# Altium footprint library ICs And Semiconductors SMD_BGA.PcbLib: 118 footprints (part 4 of 17)
Each footprint in its own frame and in the unit in brackets; x right, y up, seen from the top. Pads: shape width x height; smd on the part's side, far side on the other; paste and mask are expansions set on the pad; w line width, h text height; cw(c..) or ccw(c..) is an arc to the next point about the centre after c.
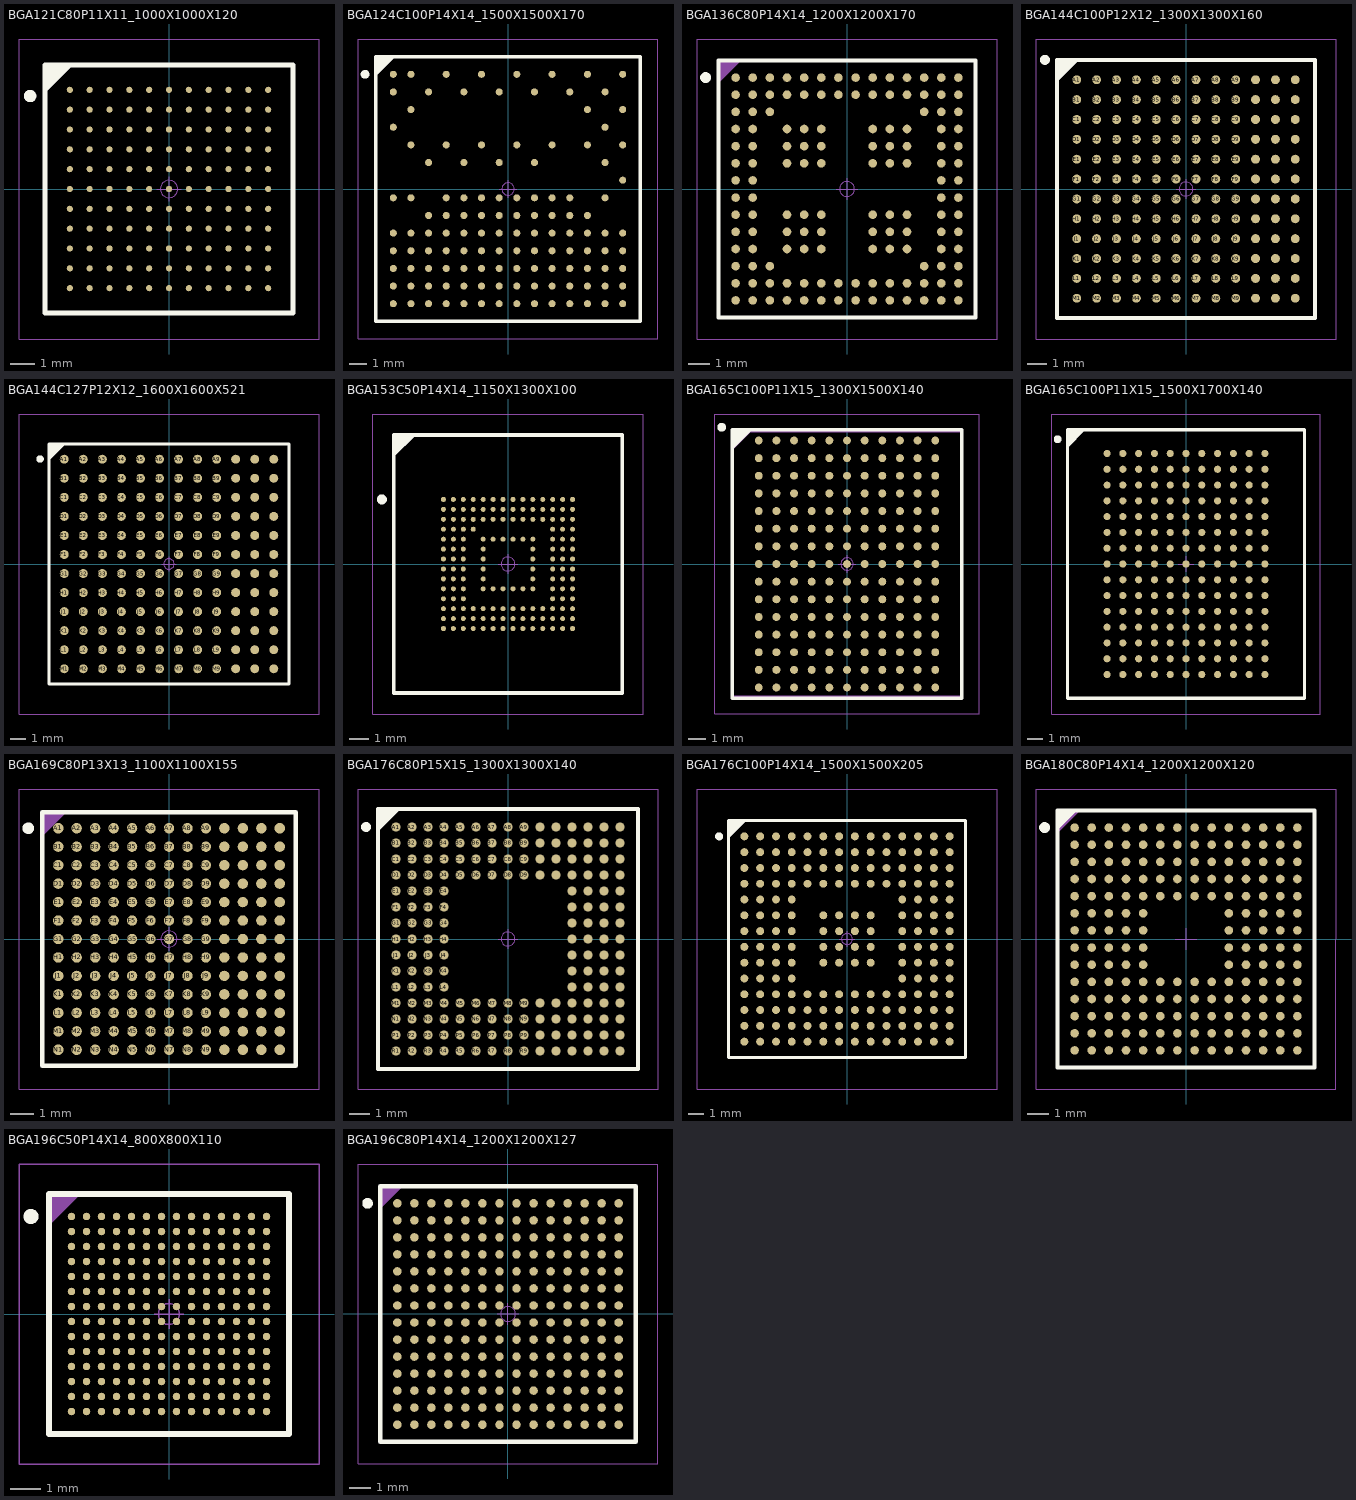
[diagram p3: the footprints below, top view; thin cyan lines are the x and y axes]

## BGA121C80P11X11_1000X1000X120 [mm] "BGA, 0.80mm Pitch, Square; 121 Pin,11 Columns X 11 Rows,10.00mm X 10.00mm X 1.20mm H"
height 1.2
pads (121):
  round 0.25 smd: A1(-4,4) A2(-3.2,4) A3(-2.4,4) A4(-1.6,4) A5(-0.8,4) A6(0,4) A7(0.8,4) A8(1.6,4) A9(2.4,4) A10(3.2,4) A11(4,4) B1(-4,3.2) B2(-3.2,3.2) B3(-2.4,3.2) B4(-1.6,3.2) B5(-0.8,3.2) B6(0,3.2) B7(0.8,3.2) B8(1.6,3.2) B9(2.4,3.2) B10(3.2,3.2) B11(4,3.2) C1(-4,2.4) C2(-3.2,2.4) C3(-2.4,2.4) C4(-1.6,2.4) C5(-0.8,2.4) C6(0,2.4) C7(0.8,2.4) C8(1.6,2.4) C9(2.4,2.4) C10(3.2,2.4) C11(4,2.4) D1(-4,1.6) D2(-3.2,1.6) D3(-2.4,1.6) D4(-1.6,1.6) D5(-0.8,1.6) D6(0,1.6) D7(0.8,1.6) D8(1.6,1.6) D9(2.4,1.6) D10(3.2,1.6) D11(4,1.6) E1(-4,0.8) E2(-3.2,0.8) E3(-2.4,0.8) E4(-1.6,0.8) E5(-0.8,0.8) E6(0,0.8) E7(0.8,0.8) E8(1.6,0.8) E9(2.4,0.8) E10(3.2,0.8) E11(4,0.8) F1(-4,0) F2(-3.2,0) F3(-2.4,0) F4(-1.6,0) F5(-0.8,0) F6(0,0) F7(0.8,0) F8(1.6,0) F9(2.4,0) F10(3.2,0) F11(4,0) G1(-4,-0.8) G2(-3.2,-0.8) G3(-2.4,-0.8) G4(-1.6,-0.8) G5(-0.8,-0.8) G6(0,-0.8) G7(0.8,-0.8) G8(1.6,-0.8) G9(2.4,-0.8) G10(3.2,-0.8) G11(4,-0.8) H1(-4,-1.6) H2(-3.2,-1.6) H3(-2.4,-1.6) H4(-1.6,-1.6) H5(-0.8,-1.6) H6(0,-1.6) H7(0.8,-1.6) H8(1.6,-1.6) H9(2.4,-1.6) H10(3.2,-1.6) H11(4,-1.6) J1(-4,-2.4) J2(-3.2,-2.4) J3(-2.4,-2.4) J4(-1.6,-2.4) J5(-0.8,-2.4) J6(0,-2.4) J7(0.8,-2.4) J8(1.6,-2.4) J9(2.4,-2.4) J10(3.2,-2.4) J11(4,-2.4) K1(-4,-3.2) K2(-3.2,-3.2) K3(-2.4,-3.2) K4(-1.6,-3.2) K5(-0.8,-3.2) K6(0,-3.2) K7(0.8,-3.2) K8(1.6,-3.2) K9(2.4,-3.2) K10(3.2,-3.2) K11(4,-3.2) L1(-4,-4) L2(-3.2,-4) L3(-2.4,-4) L4(-1.6,-4) L5(-0.8,-4) L6(0,-4) L7(0.8,-4) L8(1.6,-4) L9(2.4,-4) L10(3.2,-4) L11(4,-4)
Top Overlay:
  circle w0.25: c-5.6,3.75 r0.125
  lines w0.2: -5,4 -4,5 ; -5,4.2 -4.2,5 ; -5,4.4 -4.4,5 ; -5,4.6 -4.6,5 ; -5,4.8 -4.8,5 ; -5,-5 -5,5 5,5 5,-5 -5,-5
Mechanical 14:
  lines w0.1: -5,4 -4,5 ; -5,4.1 -4.1,5 ; -5,4.2 -4.2,5 ; -5,4.3 -4.3,5 ; -5,4.4 -4.4,5 ; -5,4.5 -4.5,5 ; -5,4.6 -4.6,5 ; -5,4.7 -4.7,5 ; -5,4.8 -4.8,5 ; -5,4.9 -4.9,5 ; -5,-5 -5,5 5,5 5,-5 -5,-5
  text "1" at -4.125,5.275 h0.4
  text "2" at -3.325,5.275 h0.4
  text "3" at -2.525,5.275 h0.4
  text "6" at -0.125,5.275 h0.4
  text "5" at -0.925,5.275 h0.4
  text "4" at -1.725,5.275 h0.4
  text "9" at 2.275,5.275 h0.4
  text "8" at 1.475,5.275 h0.4
  text "7" at 0.675,5.275 h0.4
  text "11" at 4.025,5.275 h0.4
  text "10" at 3.075,5.275 h0.4
  text "J" at -5.625,-2.475 h0.4
  text "A" at -5.625,3.925 h0.4
  text "B" at -5.625,3.125 h0.4
  text "C" at -5.625,2.325 h0.4
  text "D" at -5.625,1.525 h0.4
  text "E" at -5.625,0.725 h0.4
  text "F" at -5.625,-0.075 h0.4
  text "G" at -5.625,-0.875 h0.4
  text "H" at -5.625,-1.675 h0.4
  text "K" at -5.625,-3.275 h0.4
  text "L" at -5.625,-4.075 h0.4
Mechanical 15:
  circle w0.05: c0,0 r0.35
  lines w0.05: -0.5,0 0.5,0 ; 0,-0.5 0,0.5 ; -6.05,-6.05 -6.05,6.05 6.05,6.05 6.05,-6.05 -6.05,-6.05
3D body "BGA121C80P11X11_1000X1000X120.stp": height 1.2, standoff 0, extent -5.05,-5.05 5.05,5.05

## BGA124C100P14X14_1500X1500X170 [mm] "BGA, 1.00mm Pitch, Square;124 Pin,14 Columns X 14 Rows, 15.00mm X 15.00mm X 1.70mm H"
height 1.47
pads (124):
  round 0.4 smd: A1(-6.5,6.5) A2(-5.5,6.5) A4(-3.5,6.5) A6(-1.5,6.5) A8(0.5,6.5) A10(2.5,6.5) A12(4.5,6.5) A14(6.5,6.5) B1(-6.5,5.5) B3(-4.5,5.5) B5(-2.5,5.5) B7(-0.5,5.5) B9(1.5,5.5) B11(3.5,5.5) B13(5.5,5.5) C2(-5.5,4.5) C12(4.5,4.5) C14(6.5,4.5) D1(-6.5,3.5) D13(5.5,3.5) E2(-5.5,2.5) E4(-3.5,2.5) E6(-1.5,2.5) E8(0.5,2.5) E10(2.5,2.5) E12(4.5,2.5) E14(6.5,2.5) F3(-4.5,1.5) F5(-2.5,1.5) F7(-0.5,1.5) F9(1.5,1.5) F13(5.5,1.5) G14(6.5,0.5) H1(-6.5,-0.5) H2(-5.5,-0.5) H4(-3.5,-0.5) H5(-2.5,-0.5) H6(-1.5,-0.5) H7(-0.5,-0.5) H8(0.5,-0.5) H9(1.5,-0.5) H10(2.5,-0.5) H11(3.5,-0.5) H13(5.5,-0.5) J3(-4.5,-1.5) J4(-3.5,-1.5) J5(-2.5,-1.5) J6(-1.5,-1.5) J7(-0.5,-1.5) J8(0.5,-1.5) J9(1.5,-1.5) J10(2.5,-1.5) J11(3.5,-1.5) J12(4.5,-1.5) K1(-6.5,-2.5) K2(-5.5,-2.5) K3(-4.5,-2.5) K4(-3.5,-2.5) K5(-2.5,-2.5) K6(-1.5,-2.5) K7(-0.5,-2.5) K8(0.5,-2.5) K9(1.5,-2.5) K10(2.5,-2.5) K11(3.5,-2.5) K12(4.5,-2.5) K13(5.5,-2.5) K14(6.5,-2.5) L1(-6.5,-3.5) L2(-5.5,-3.5) L3(-4.5,-3.5) L4(-3.5,-3.5) L5(-2.5,-3.5) L6(-1.5,-3.5) L7(-0.5,-3.5) L8(0.5,-3.5) L9(1.5,-3.5) L10(2.5,-3.5) L11(3.5,-3.5) L12(4.5,-3.5) L13(5.5,-3.5) L14(6.5,-3.5) M1(-6.5,-4.5) M2(-5.5,-4.5) M3(-4.5,-4.5) M4(-3.5,-4.5) M5(-2.5,-4.5) M6(-1.5,-4.5) M7(-0.5,-4.5) M8(0.5,-4.5) M9(1.5,-4.5) M10(2.5,-4.5) M11(3.5,-4.5) M12(4.5,-4.5) M13(5.5,-4.5) M14(6.5,-4.5) N1(-6.5,-5.5) N2(-5.5,-5.5) N3(-4.5,-5.5) N4(-3.5,-5.5) N5(-2.5,-5.5) N6(-1.5,-5.5) N7(-0.5,-5.5) N8(0.5,-5.5) N9(1.5,-5.5) N10(2.5,-5.5) N11(3.5,-5.5) N12(4.5,-5.5) N13(5.5,-5.5) N14(6.5,-5.5) P1(-6.5,-6.5) P2(-5.5,-6.5) P3(-4.5,-6.5) P4(-3.5,-6.5) P5(-2.5,-6.5) P6(-1.5,-6.5) P7(-0.5,-6.5) P8(0.5,-6.5) P9(1.5,-6.5) P10(2.5,-6.5) P11(3.5,-6.5) P12(4.5,-6.5) P13(5.5,-6.5) P14(6.5,-6.5)
Top Overlay:
  circle w0.25: c-8.1,6.5 r0.125
  circle w0.25: c-8.1,6.5 r0.125
  lines w0.2: -7.5,6.5 -6.5,7.5 ; -7.5,6.7 -6.7,7.5 ; -7.5,6.9 -6.9,7.5 ; -7.5,7.1 -7.1,7.5 ; -7.5,7.3 -7.3,7.5 ; -7.5,-7.5 7.5,-7.5 7.5,7.5 -7.5,7.5 -7.5,-7.5
Mechanical 14:
  lines w0.1: -7.5,6.5 -6.5,7.5 ; -7.5,6.6 -6.6,7.5 ; -7.5,6.7 -6.7,7.5 ; -7.5,6.8 -6.8,7.5 ; -7.5,6.9 -6.9,7.5 ; -7.5,7 -7,7.5 ; -7.5,7.1 -7.1,7.5 ; -7.5,7.2 -7.2,7.5 ; -7.5,7.3 -7.3,7.5 ; -7.5,7.4 -7.4,7.5 ; -7.5,-7.5 7.5,-7.5 7.5,7.5 -7.5,7.5 -7.5,-7.5
  text "P" at -8.4,-6.8 h0.6
  text "N" at -8.4,-5.8 h0.6
  text "M" at -8.4,-4.8 h0.6
  text "L" at -8.4,-3.8 h0.6
  text "K" at -8.4,-2.8 h0.6
  text "J" at -8.4,-1.8 h0.6
  text "H" at -8.4,-0.8 h0.6
  text "G" at -8.4,0.2 h0.6
  text "F" at -8.4,1.2 h0.6
  text "E" at -8.4,2.2 h0.6
  text "D" at -8.4,3.2 h0.6
  text "C" at -8.4,4.2 h0.6
  text "B" at -8.4,5.2 h0.6
  text "A" at -8.4,6.2 h0.6
  text "2" at -5.125,8 h0.6
  text "3" at -4.125,8 h0.6
  text "4" at -3.125,8 h0.6
  text "5" at -2.125,8 h0.6
  text "14" at 6.65,8 h0.6
  text "13" at 5.675,8 h0.6
  text "12" at 4.7,8 h0.6
  text "11" at 3.775,8 h0.6
  text "10" at 2.725,8 h0.6
  text "9" at 1.925,8 h0.6
  text "8" at 0.85,8 h0.6
  text "7" at -0.125,8 h0.6
  text "6" at -1.125,8 h0.6
  text "1" at -6.075,8 h0.6
Mechanical 15:
  circle w0.05: c0,0 r0.35
  lines w0.05: -0.5,0 0.5,0 ; 0,-0.5 0,0.5 ; -8.5,-8.5 8.5,-8.5 8.5,8.5 -8.5,8.5 -8.5,-8.5
3D body "BGA124C100P14X14_1500X1500X170.stp": height 1.7, standoff 0, extent -7.6,-7.6 7.6,7.6

## BGA136C80P14X14_1200X1200X170 [mm] "BGA, 0.80mm Pitch, Square; 136 Pin, 14 Columns X 14 Rows, 12.00mm X 12.00mm X 1.70mm H"
height 1.7
pads (136):
  round 0.4 smd: A1(-5.2,5.2) A2(-4.4,5.2) A3(-3.6,5.2) A4(-2.8,5.2) A5(-2,5.2) A6(-1.2,5.2) A7(-0.4,5.2) A8(0.4,5.2) A9(1.2,5.2) A10(2,5.2) A11(2.8,5.2) A12(3.6,5.2) A13(4.4,5.2) A14(5.2,5.2) B1(-5.2,4.4) B2(-4.4,4.4) B3(-3.6,4.4) B4(-2.8,4.4) B5(-2,4.4) B6(-1.2,4.4) B7(-0.4,4.4) B8(0.4,4.4) B9(1.2,4.4) B10(2,4.4) B11(2.8,4.4) B12(3.6,4.4) B13(4.4,4.4) B14(5.2,4.4) C1(-5.2,3.6) C2(-4.4,3.6) C3(-3.6,3.6) C12(3.6,3.6) C13(4.4,3.6) C14(5.2,3.6) D1(-5.2,2.8) D2(-4.4,2.8) D4(-2.8,2.8) D5(-2,2.8) D6(-1.2,2.8) D9(1.2,2.8) D10(2,2.8) D11(2.8,2.8) D13(4.4,2.8) D14(5.2,2.8) E1(-5.2,2) E2(-4.4,2) E4(-2.8,2) E5(-2,2) E6(-1.2,2) E9(1.2,2) E10(2,2) E11(2.8,2) E13(4.4,2) E14(5.2,2) F1(-5.2,1.2) F2(-4.4,1.2) F4(-2.8,1.2) F5(-2,1.2) F6(-1.2,1.2) F9(1.2,1.2) F10(2,1.2) F11(2.8,1.2) F13(4.4,1.2) F14(5.2,1.2) G1(-5.2,0.4) G2(-4.4,0.4) G13(4.4,0.4) G14(5.2,0.4) H1(-5.2,-0.4) H2(-4.4,-0.4) H13(4.4,-0.4) H14(5.2,-0.4) J1(-5.2,-1.2) J2(-4.4,-1.2) J4(-2.8,-1.2) J5(-2,-1.2) J6(-1.2,-1.2) J9(1.2,-1.2) J10(2,-1.2) J11(2.8,-1.2) J13(4.4,-1.2) J14(5.2,-1.2) K1(-5.2,-2) K2(-4.4,-2) K4(-2.8,-2) K5(-2,-2) K6(-1.2,-2) K9(1.2,-2) K10(2,-2) K11(2.8,-2) K13(4.4,-2) K14(5.2,-2) L1(-5.2,-2.8) L2(-4.4,-2.8) L4(-2.8,-2.8) L5(-2,-2.8) L6(-1.2,-2.8) L9(1.2,-2.8) L10(2,-2.8) L11(2.8,-2.8) L13(4.4,-2.8) L14(5.2,-2.8) M1(-5.2,-3.6) M2(-4.4,-3.6) M3(-3.6,-3.6) M12(3.6,-3.6) M13(4.4,-3.6) M14(5.2,-3.6) N1(-5.2,-4.4) N2(-4.4,-4.4) N3(-3.6,-4.4) N4(-2.8,-4.4) N5(-2,-4.4) N6(-1.2,-4.4) N7(-0.4,-4.4) N8(0.4,-4.4) N9(1.2,-4.4) N10(2,-4.4) N11(2.8,-4.4) N12(3.6,-4.4) N13(4.4,-4.4) N14(5.2,-4.4) P1(-5.2,-5.2) P2(-4.4,-5.2) P3(-3.6,-5.2) P4(-2.8,-5.2) P5(-2,-5.2) P6(-1.2,-5.2) P7(-0.4,-5.2) P8(0.4,-5.2) P9(1.2,-5.2) P10(2,-5.2) P11(2.8,-5.2) P12(3.6,-5.2) P13(4.4,-5.2) P14(5.2,-5.2)
Top Overlay:
  circle w0.25: c-6.6,5.2 r0.125
  lines w0.2: -6,-6 6,-6 6,6 -6,6 -6,-6
Mechanical 14:
  lines w0.1: -6,5 -5,6 ; -6,5.1 -5.1,6 ; -6,5.2 -5.2,6 ; -6,5.3 -5.3,6 ; -6,5.4 -5.4,6 ; -6,5.5 -5.5,6 ; -6,5.6 -5.6,6 ; -6,5.7 -5.7,6 ; -6,5.8 -5.8,6 ; -6,5.9 -5.9,6 ; -6,-6 6,-6 6,6 -6,6 -6,-6
  text "J" at -6.5,-1.2 h0.4
  text "P" at -6.5,-5.2 h0.4
  text "N" at -6.5,-4.4 h0.4
  text "A" at -6.5,5.2 h0.4
  text "B" at -6.5,4.4 h0.4
  text "C" at -6.5,3.6 h0.4
  text "D" at -6.5,2.8 h0.4
  text "E" at -6.5,2 h0.4
  text "F" at -6.5,1.2 h0.4
  text "G" at -6.5,0.4 h0.4
  text "H" at -6.5,-0.4 h0.4
  text "M" at -6.5,-3.6 h0.4
  text "K" at -6.5,-2 h0.4
  text "L" at -6.5,-2.8 h0.4
  text "1" at -5.325,6.475 h0.4
  text "2" at -4.525,6.475 h0.4
  text "3" at -3.725,6.475 h0.4
  text "6" at -1.325,6.475 h0.4
  text "5" at -2.125,6.475 h0.4
  text "4" at -2.925,6.475 h0.4
  text "9" at 1.075,6.475 h0.4
  text "8" at 0.275,6.475 h0.4
  text "7" at -0.525,6.475 h0.4
  text "12" at 3.475,6.475 h0.4
  text "11" at 2.675,6.475 h0.4
  text "10" at 1.875,6.475 h0.4
  text "13" at 4.275,6.475 h0.4
  text "14" at 5.075,6.475 h0.4
Mechanical 15:
  circle w0.05: c0,0 r0.35
  lines w0.05: -0.5,0 0.5,0 ; 0,-0.5 0,0.5 ; -7,-7 7,-7 7,7 -7,7 -7,-7
3D body "BGA136C80P14X14_1200X1200X170.stp": height 1.7, standoff 0, extent -6.05,-6.05 6.05,6.05

## BGA144C100P12X12_1300X1300X160 [mm] "BGA, 1.00mm pitch, square; 144 pin, 12 columns X 12 rows,13.00mm X 13.00mm X 1.60mm H"
height 1.6
pads (144):
  round 0.45 smd: A1(-5.5,5.5) A2(-4.5,5.5) A3(-3.5,5.5) A4(-2.5,5.5) A5(-1.5,5.5) A6(-0.5,5.5) A7(0.5,5.5) A8(1.5,5.5) A9(2.5,5.5) A10(3.5,5.5) A11(4.5,5.5) A12(5.5,5.5) B1(-5.5,4.5) B2(-4.5,4.5) B3(-3.5,4.5) B4(-2.5,4.5) B5(-1.5,4.5) B6(-0.5,4.5) B7(0.5,4.5) B8(1.5,4.5) B9(2.5,4.5) B10(3.5,4.5) B11(4.5,4.5) B12(5.5,4.5) C1(-5.5,3.5) C2(-4.5,3.5) C3(-3.5,3.5) C4(-2.5,3.5) C5(-1.5,3.5) C6(-0.5,3.5) C7(0.5,3.5) C8(1.5,3.5) C9(2.5,3.5) C10(3.5,3.5) C11(4.5,3.5) C12(5.5,3.5) D1(-5.5,2.5) D2(-4.5,2.5) D3(-3.5,2.5) D4(-2.5,2.5) D5(-1.5,2.5) D6(-0.5,2.5) D7(0.5,2.5) D8(1.5,2.5) D9(2.5,2.5) D10(3.5,2.5) D11(4.5,2.5) D12(5.5,2.5) E1(-5.5,1.5) E2(-4.5,1.5) E3(-3.5,1.5) E4(-2.5,1.5) E5(-1.5,1.5) E6(-0.5,1.5) E7(0.5,1.5) E8(1.5,1.5) E9(2.5,1.5) E10(3.5,1.5) E11(4.5,1.5) E12(5.5,1.5) F1(-5.5,0.5) F2(-4.5,0.5) F3(-3.5,0.5) F4(-2.5,0.5) F5(-1.5,0.5) F6(-0.5,0.5) F7(0.5,0.5) F8(1.5,0.5) F9(2.5,0.5) F10(3.5,0.5) F11(4.5,0.5) F12(5.5,0.5) G1(-5.5,-0.5) G2(-4.5,-0.5) G3(-3.5,-0.5) G4(-2.5,-0.5) G5(-1.5,-0.5) G6(-0.5,-0.5) G7(0.5,-0.5) G8(1.5,-0.5) G9(2.5,-0.5) G10(3.5,-0.5) G11(4.5,-0.5) G12(5.5,-0.5) H1(-5.5,-1.5) H2(-4.5,-1.5) H3(-3.5,-1.5) H4(-2.5,-1.5) H5(-1.5,-1.5) H6(-0.5,-1.5) H7(0.5,-1.5) H8(1.5,-1.5) H9(2.5,-1.5) H10(3.5,-1.5) H11(4.5,-1.5) H12(5.5,-1.5) J1(-5.5,-2.5) J2(-4.5,-2.5) J3(-3.5,-2.5) J4(-2.5,-2.5) J5(-1.5,-2.5) J6(-0.5,-2.5) J7(0.5,-2.5) J8(1.5,-2.5) J9(2.5,-2.5) J10(3.5,-2.5) J11(4.5,-2.5) J12(5.5,-2.5) K1(-5.5,-3.5) K2(-4.5,-3.5) K3(-3.5,-3.5) K4(-2.5,-3.5) K5(-1.5,-3.5) K6(-0.5,-3.5) K7(0.5,-3.5) K8(1.5,-3.5) K9(2.5,-3.5) K10(3.5,-3.5) K11(4.5,-3.5) K12(5.5,-3.5) L1(-5.5,-4.5) L2(-4.5,-4.5) L3(-3.5,-4.5) L4(-2.5,-4.5) L5(-1.5,-4.5) L6(-0.5,-4.5) L7(0.5,-4.5) L8(1.5,-4.5) L9(2.5,-4.5) L10(3.5,-4.5) L11(4.5,-4.5) L12(5.5,-4.5) M1(-5.5,-5.5) M2(-4.5,-5.5) M3(-3.5,-5.5) M4(-2.5,-5.5) M5(-1.5,-5.5) M6(-0.5,-5.5) M7(0.5,-5.5) M8(1.5,-5.5) M9(2.5,-5.5) M10(3.5,-5.5) M11(4.5,-5.5) M12(5.5,-5.5)
Top Overlay:
  circle w0.25: c-7.1,6.5 r0.125
  lines w0.2: -6.5,5.5 -5.5,6.5 ; -6.5,5.7 -5.7,6.5 ; -6.5,5.9 -5.9,6.5 ; -6.5,6.1 -6.1,6.5 ; -6.5,6.3 -6.3,6.5 ; -6.5,-6.5 -6.5,6.5 6.5,6.5 6.5,-6.5 -6.5,-6.5
Mechanical 14:
  lines w0.1: -6.5,5.5 -5.5,6.5 ; -6.5,5.6 -5.6,6.5 ; -6.5,5.7 -5.7,6.5 ; -6.5,5.8 -5.8,6.5 ; -6.5,5.9 -5.9,6.5 ; -6.5,6 -6,6.5 ; -6.5,6.1 -6.1,6.5 ; -6.5,6.2 -6.2,6.5 ; -6.5,6.3 -6.3,6.5 ; -6.5,6.4 -6.4,6.5 ; -6.5,-6.5 -6.5,6.5 6.5,6.5 6.5,-6.5 -6.5,-6.5
  text "12" at 5.675,6.9 h0.6
  text "A" at -7.3,5.2 h0.6
  text "B" at -7.3,4.2 h0.6
  text "C" at -7.3,3.2 h0.6
  text "D" at -7.3,2.2 h0.6
  text "E" at -7.3,1.2 h0.6
  text "F" at -7.3,0.2 h0.6
  text "G" at -7.3,-0.8 h0.6
  text "H" at -7.3,-1.8 h0.6
  text "J" at -7.3,-2.8 h0.6
  text "K" at -7.3,-3.8 h0.6
  text "L" at -7.3,-4.8 h0.6
  text "M" at -7.3,-5.8 h0.6
  text "1" at -5.175,6.9 h0.6
  text "6" at -0.225,6.9 h0.6
  text "7" at 0.775,6.9 h0.6
  text "8" at 1.75,6.9 h0.6
  text "9" at 2.825,6.9 h0.6
  text "10" at 3.625,6.9 h0.6
  text "11" at 4.675,6.9 h0.6
  text "5" at -1.225,6.9 h0.6
  text "4" at -2.225,6.9 h0.6
  text "3" at -3.225,6.9 h0.6
  text "2" at -4.225,6.9 h0.6
Mechanical 15:
  circle w0.05: c0,0 r0.35
  lines w0.05: -0.5,0 0.5,0 ; 0,-0.5 0,0.5 ; -7.55,-7.55 -7.55,7.55 7.55,7.55 7.55,-7.55 -7.55,-7.55
3D body "BGA144C100P12X12_1300X1300X160.stp": height 1.55, standoff 0, extent -6.5,-6.5 6.5,6.5

## BGA144C127P12X12_1600X1600X521 [mm] "BGA, 1.27mm Pitch, Square; 144 Pin, 12 Columns X 12 Rows,16.00mm X 16.00mm X 5.21mm H"
height 5.21
pads (144):
  round 0.6 smd: A1(-6.985,6.985) A2(-5.715,6.985) A3(-4.445,6.985) A4(-3.175,6.985) A5(-1.905,6.985) A6(-0.635,6.985) A7(0.635,6.985) A8(1.905,6.985) A9(3.175,6.985) A10(4.445,6.985) A11(5.715,6.985) A12(6.985,6.985) B1(-6.985,5.715) B2(-5.715,5.715) B3(-4.445,5.715) B4(-3.175,5.715) B5(-1.905,5.715) B6(-0.635,5.715) B7(0.635,5.715) B8(1.905,5.715) B9(3.175,5.715) B10(4.445,5.715) B11(5.715,5.715) B12(6.985,5.715) C1(-6.985,4.445) C2(-5.715,4.445) C3(-4.445,4.445) C4(-3.175,4.445) C5(-1.905,4.445) C6(-0.635,4.445) C7(0.635,4.445) C8(1.905,4.445) C9(3.175,4.445) C10(4.445,4.445) C11(5.715,4.445) C12(6.985,4.445) D1(-6.985,3.175) D2(-5.715,3.175) D3(-4.445,3.175) D4(-3.175,3.175) D5(-1.905,3.175) D6(-0.635,3.175) D7(0.635,3.175) D8(1.905,3.175) D9(3.175,3.175) D10(4.445,3.175) D11(5.715,3.175) D12(6.985,3.175) E1(-6.985,1.905) E2(-5.715,1.905) E3(-4.445,1.905) E4(-3.175,1.905) E5(-1.905,1.905) E6(-0.635,1.905) E7(0.635,1.905) E8(1.905,1.905) E9(3.175,1.905) E10(4.445,1.905) E11(5.715,1.905) E12(6.985,1.905) F1(-6.985,0.635) F2(-5.715,0.635) F3(-4.445,0.635) F4(-3.175,0.635) F5(-1.905,0.635) F6(-0.635,0.635) F7(0.635,0.635) F8(1.905,0.635) F9(3.175,0.635) F10(4.445,0.635) F11(5.715,0.635) F12(6.985,0.635) G1(-6.985,-0.635) G2(-5.715,-0.635) G3(-4.445,-0.635) G4(-3.175,-0.635) G5(-1.905,-0.635) G6(-0.635,-0.635) G7(0.635,-0.635) G8(1.905,-0.635) G9(3.175,-0.635) G10(4.445,-0.635) G11(5.715,-0.635) G12(6.985,-0.635) H1(-6.985,-1.905) H2(-5.715,-1.905) H3(-4.445,-1.905) H4(-3.175,-1.905) H5(-1.905,-1.905) H6(-0.635,-1.905) H7(0.635,-1.905) H8(1.905,-1.905) H9(3.175,-1.905) H10(4.445,-1.905) H11(5.715,-1.905) H12(6.985,-1.905) J1(-6.985,-3.175) J2(-5.715,-3.175) J3(-4.445,-3.175) J4(-3.175,-3.175) J5(-1.905,-3.175) J6(-0.635,-3.175) J7(0.635,-3.175) J8(1.905,-3.175) J9(3.175,-3.175) J10(4.445,-3.175) J11(5.715,-3.175) J12(6.985,-3.175) K1(-6.985,-4.445) K2(-5.715,-4.445) K3(-4.445,-4.445) K4(-3.175,-4.445) K5(-1.905,-4.445) K6(-0.635,-4.445) K7(0.635,-4.445) K8(1.905,-4.445) K9(3.175,-4.445) K10(4.445,-4.445) K11(5.715,-4.445) K12(6.985,-4.445) L1(-6.985,-5.715) L2(-5.715,-5.715) L3(-4.445,-5.715) L4(-3.175,-5.715) L5(-1.905,-5.715) L6(-0.635,-5.715) L7(0.635,-5.715) L8(1.905,-5.715) L9(3.175,-5.715) L10(4.445,-5.715) L11(5.715,-5.715) L12(6.985,-5.715) M1(-6.985,-6.985) M2(-5.715,-6.985) M3(-4.445,-6.985) M4(-3.175,-6.985) M5(-1.905,-6.985) M6(-0.635,-6.985) M7(0.635,-6.985) M8(1.905,-6.985) M9(3.175,-6.985) M10(4.445,-6.985) M11(5.715,-6.985) M12(6.985,-6.985)
Top Overlay:
  circle w0.25: c-8.6,7 r0.125
  lines w0.2: -8,7 -7,8 ; -8,7.2 -7.2,8 ; -8,7.4 -7.4,8 ; -8,7.6 -7.6,8 ; -8,7.8 -7.8,8 ; -8,-8 -8,8 8,8 8,-8 -8,-8
Mechanical 14:
  lines w0.1: -8,7 -7,8 ; -8,7.1 -7.1,8 ; -8,7.2 -7.2,8 ; -8,7.3 -7.3,8 ; -8,7.4 -7.4,8 ; -8,7.5 -7.5,8 ; -8,7.6 -7.6,8 ; -8,7.7 -7.7,8 ; -8,7.8 -7.8,8 ; -8,7.9 -7.9,8 ; -8,-8 -8,8 8,8 8,-8 -8,-8
  text "9" at 3.048,8.247 h0.4
  text "1" at -7.112,8.247 h0.4
  text "2" at -5.842,8.247 h0.4
  text "3" at -4.572,8.247 h0.4
  text "4" at -3.302,8.247 h0.4
  text "5" at -2.032,8.247 h0.4
  text "6" at -0.762,8.247 h0.4
  text "7" at 0.508,8.247 h0.4
  text "8" at 1.778,8.247 h0.4
  text "10" at 4.318,8.247 h0.4
  text "11" at 5.588,8.247 h0.4
  text "12" at 6.858,8.247 h0.4
  text "F" at -8.501,0.508 h0.4
  text "E" at -8.501,1.778 h0.4
  text "D" at -8.501,3.048 h0.4
  text "G" at -8.501,-0.762 h0.4
  text "C" at -8.501,4.318 h0.4
  text "B" at -8.501,5.588 h0.4
  text "A" at -8.501,6.858 h0.4
  text "H" at -8.501,-2.032 h0.4
  text "I" at -8.426,-3.302 h0.4
  text "J" at -8.555,-4.597 h0.4
  text "K" at -8.555,-5.867 h0.4
  text "L" at -8.555,-7.137 h0.4
Mechanical 15:
  circle w0.05: c0,0 r0.35
  lines w0.05: -0.5,0 0.5,0 ; 0,-0.5 0,0.5 ; -10,-10 -10,10 10,10 10,-10 -10,-10
3D body "BGA144C127P12X12_1600X1600X521.stp": height 5.21, standoff 0, extent -8,-8 8,8

## BGA153C50P14X14_1150X1300X100 [mm] "BGA, 0.50mm Pitch, Rect.; 153 Pin, 14 Columns X 14 Rows, 11.50mm X 13.00mm X 1.00mm H"
height 1
pads (153):
  round 0.25 smd: A1(-3.25,3.25) A2(-2.75,3.25) A3(-2.25,3.25) A4(-1.75,3.25) A5(-1.25,3.25) A6(-0.75,3.25) A7(-0.25,3.25) A8(0.25,3.25) A9(0.75,3.25) A10(1.25,3.25) A11(1.75,3.25) A12(2.25,3.25) A13(2.75,3.25) A14(3.25,3.25) B1(-3.25,2.75) B2(-2.75,2.75) B3(-2.25,2.75) B4(-1.75,2.75) B5(-1.25,2.75) B6(-0.75,2.75) B7(-0.25,2.75) B8(0.25,2.75) B9(0.75,2.75) B10(1.25,2.75) B11(1.75,2.75) B12(2.25,2.75) B13(2.75,2.75) B14(3.25,2.75) C1(-3.25,2.25) C2(-2.75,2.25) C3(-2.25,2.25) C4(-1.75,2.25) C5(-1.25,2.25) C6(-0.75,2.25) C7(-0.25,2.25) C8(0.25,2.25) C9(0.75,2.25) C10(1.25,2.25) C11(1.75,2.25) C12(2.25,2.25) C13(2.75,2.25) C14(3.25,2.25) D1(-3.25,1.75) D2(-2.75,1.75) D3(-2.25,1.75) D4(-1.75,1.75) D12(2.25,1.75) D13(2.75,1.75) D14(3.25,1.75) E1(-3.25,1.25) E2(-2.75,1.25) E3(-2.25,1.25) E5(-1.25,1.25) E6(-0.75,1.25) E7(-0.25,1.25) E8(0.25,1.25) E9(0.75,1.25) E10(1.25,1.25) E12(2.25,1.25) E13(2.75,1.25) E14(3.25,1.25) F1(-3.25,0.75) F2(-2.75,0.75) F3(-2.25,0.75) F5(-1.25,0.75) F10(1.25,0.75) F12(2.25,0.75) F13(2.75,0.75) F14(3.25,0.75) G1(-3.25,0.25) G2(-2.75,0.25) G3(-2.25,0.25) G5(-1.25,0.25) G10(1.25,0.25) G12(2.25,0.25) G13(2.75,0.25) G14(3.25,0.25) H1(-3.25,-0.25) H2(-2.75,-0.25) H3(-2.25,-0.25) H5(-1.25,-0.25) H10(1.25,-0.25) H12(2.25,-0.25) H13(2.75,-0.25) H14(3.25,-0.25) J1(-3.25,-0.75) J2(-2.75,-0.75) J3(-2.25,-0.75) J5(-1.25,-0.75) J10(1.25,-0.75) J12(2.25,-0.75) J13(2.75,-0.75) J14(3.25,-0.75) K1(-3.25,-1.25) K2(-2.75,-1.25) K3(-2.25,-1.25) K5(-1.25,-1.25) K6(-0.75,-1.25) K7(-0.25,-1.25) K8(0.25,-1.25) K9(0.75,-1.25) K10(1.25,-1.25) K12(2.25,-1.25) K13(2.75,-1.25) K14(3.25,-1.25) L1(-3.25,-1.75) L2(-2.75,-1.75) L3(-2.25,-1.75) L12(2.25,-1.75) L13(2.75,-1.75) L14(3.25,-1.75) M1(-3.25,-2.25) M2(-2.75,-2.25) M3(-2.25,-2.25) M4(-1.75,-2.25) M5(-1.25,-2.25) M6(-0.75,-2.25) M7(-0.25,-2.25) M8(0.25,-2.25) M9(0.75,-2.25) M10(1.25,-2.25) M11(1.75,-2.25) M12(2.25,-2.25) M13(2.75,-2.25) M14(3.25,-2.25) N1(-3.25,-2.75) N2(-2.75,-2.75) N3(-2.25,-2.75) N4(-1.75,-2.75) N5(-1.25,-2.75) N6(-0.75,-2.75) N7(-0.25,-2.75) N8(0.25,-2.75) N9(0.75,-2.75) N10(1.25,-2.75) N11(1.75,-2.75) N12(2.25,-2.75) N13(2.75,-2.75) N14(3.25,-2.75) P1(-3.25,-3.25) P2(-2.75,-3.25) P3(-2.25,-3.25) P4(-1.75,-3.25) P5(-1.25,-3.25) P6(-0.75,-3.25) P7(-0.25,-3.25) P8(0.25,-3.25) P9(0.75,-3.25) P10(1.25,-3.25) P11(1.75,-3.25) P12(2.25,-3.25) P13(2.75,-3.25) P14(3.25,-3.25)
Top Overlay:
  circle w0.25: c-6.35,3.25 r0.125
  lines w0.2: -5.75,5.5 -4.75,6.5 ; -5.75,5.7 -4.95,6.5 ; -5.75,5.9 -5.15,6.5 ; -5.75,6.1 -5.35,6.5 ; -5.75,6.3 -5.55,6.5 ; -5.75,-6.5 -5.75,6.5 5.75,6.5 5.75,-6.5 -5.75,-6.5
Mechanical 14:
  lines w0.1: -5.75,5.5 -4.75,6.5 ; -5.75,5.6 -4.85,6.5 ; -5.75,5.7 -4.95,6.5 ; -5.75,5.8 -5.05,6.5 ; -5.75,5.9 -5.15,6.5 ; -5.75,6 -5.25,6.5 ; -5.75,6.1 -5.35,6.5 ; -5.75,6.2 -5.45,6.5 ; -5.75,6.3 -5.55,6.5 ; -5.75,6.4 -5.65,6.5 ; -5.75,-6.5 -5.75,6.5 5.75,6.5 5.75,-6.5 -5.75,-6.5
Mechanical 15:
  circle w0.05: c0,0 r0.35
  lines w0.05: -0.5,0 0.5,0 ; 0,-0.5 0,0.5 ; -6.8,-7.55 -6.8,7.55 6.8,7.55 6.8,-7.55 -6.8,-7.55
3D body "BGA153C50P14X14_1150X1300X100.stp": height 1, standoff 0, extent -5.75,-6.5 5.75,6.5
